# Altium footprint library esp32_nodemcu_vs.PcbLib: 1 footprints
Each footprint in its own frame and in the unit in brackets; x right, y up, seen from the top. Pads: shape width x height; smd on the part's side, far side on the other; paste and mask are expansions set on the pad; w line width, h text height; cw(c..) or ccw(c..) is an arc to the next point about the centre after c.
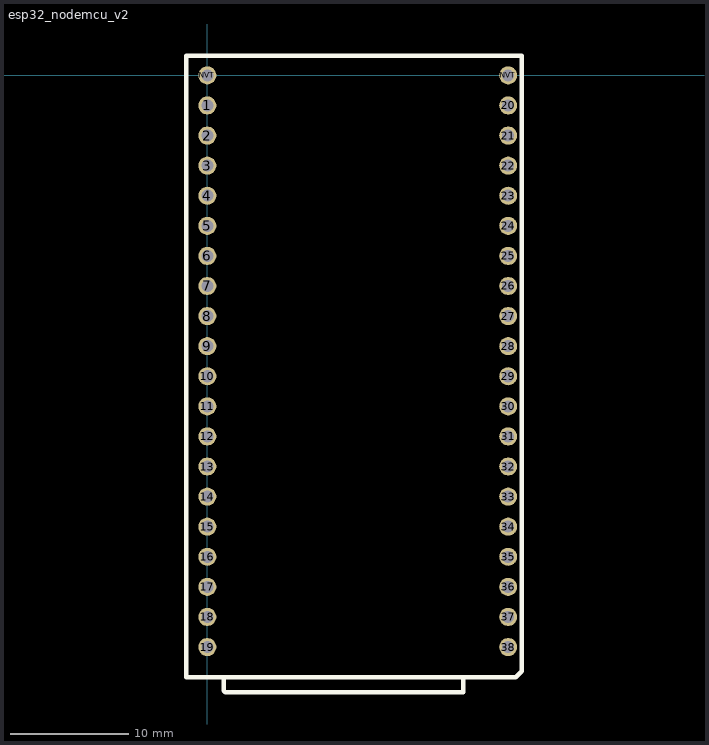
[diagram p0: the footprint, top view; thin cyan lines are the x and y axes]

## esp32_nodemcu_v2 [mil]
pads (40):
  round 60 hole 40: 1(0,-100) 2(0,-200) 3(0,-300) 4(0,-400) 5(0,-500) 6(0,-600) 7(0,-700) 8(0,-800) 9(0,-900) 10(0,-1000) 11(0,-1100) 12(0,-1200) 13(0,-1300) 14(0,-1400) 15(0,-1500) 16(0,-1600) 17(0,-1700) 18(0,-1800) 19(0,-1900) 20(1000,-100) 21(1000,-200) 22(1000,-300) 23(1000,-400) 24(1000,-500) 25(1000,-600) 26(1000,-700) 27(1000,-800) 28(1000,-900) 29(1000,-1000) 30(1000,-1100) 31(1000,-1200) 32(1000,-1300) 33(1000,-1400) 34(1000,-1500) 35(1000,-1600) 36(1000,-1700) 37(1000,-1800) 38(1000,-1900) NVT(0,0) NVT(1000,0)
Top Overlay:
  lines w15: 55,-2010 55,-2045 60,-2050 850,-2050 850,-2010 ; -70,-2000 965,-2000 1025,-2000 1045,-1980 1045,65 965,65 -70,65 -70,-2000
3D body "zl262-10s_p2-54_l25-9_w2-5_h8-5.stp": height 334.65, standoff -118.11, extent -45,-1959.69 55,-940
3D body "zl262-10s_p2-54_l25-9_w2-5_h8-5.stp": height 334.65, standoff -118.11, extent 955,-970 1055,49.69
3D body "zl262-10s_p2-54_l25-9_w2-5_h8-5.stp": height 334.65, standoff -118.11, extent 955,-1964.84 1055,-945.16
3D body "zl262-10s_p2-54_l25-9_w2-5_h8-5.stp": height 334.65, standoff -118.11, extent -45,-959.84 55,59.84
3D body "ESP32S Dev Board 0.9inch width ASSY.STEP": height 681.1, standoff 163.78, extent -5,-1971.49 1015,-30